# Altium footprint library Footprint-Lib-PhilsLab.PcbLib: 210 footprints (part 9 of 14)
Each footprint in its own frame and in the unit in brackets; x right, y up, seen from the top. Pads: shape width x height; smd on the part's side, far side on the other; paste and mask are expansions set on the pad; w line width, h text height; cw(c..) or ccw(c..) is an arc to the next point about the centre after c.
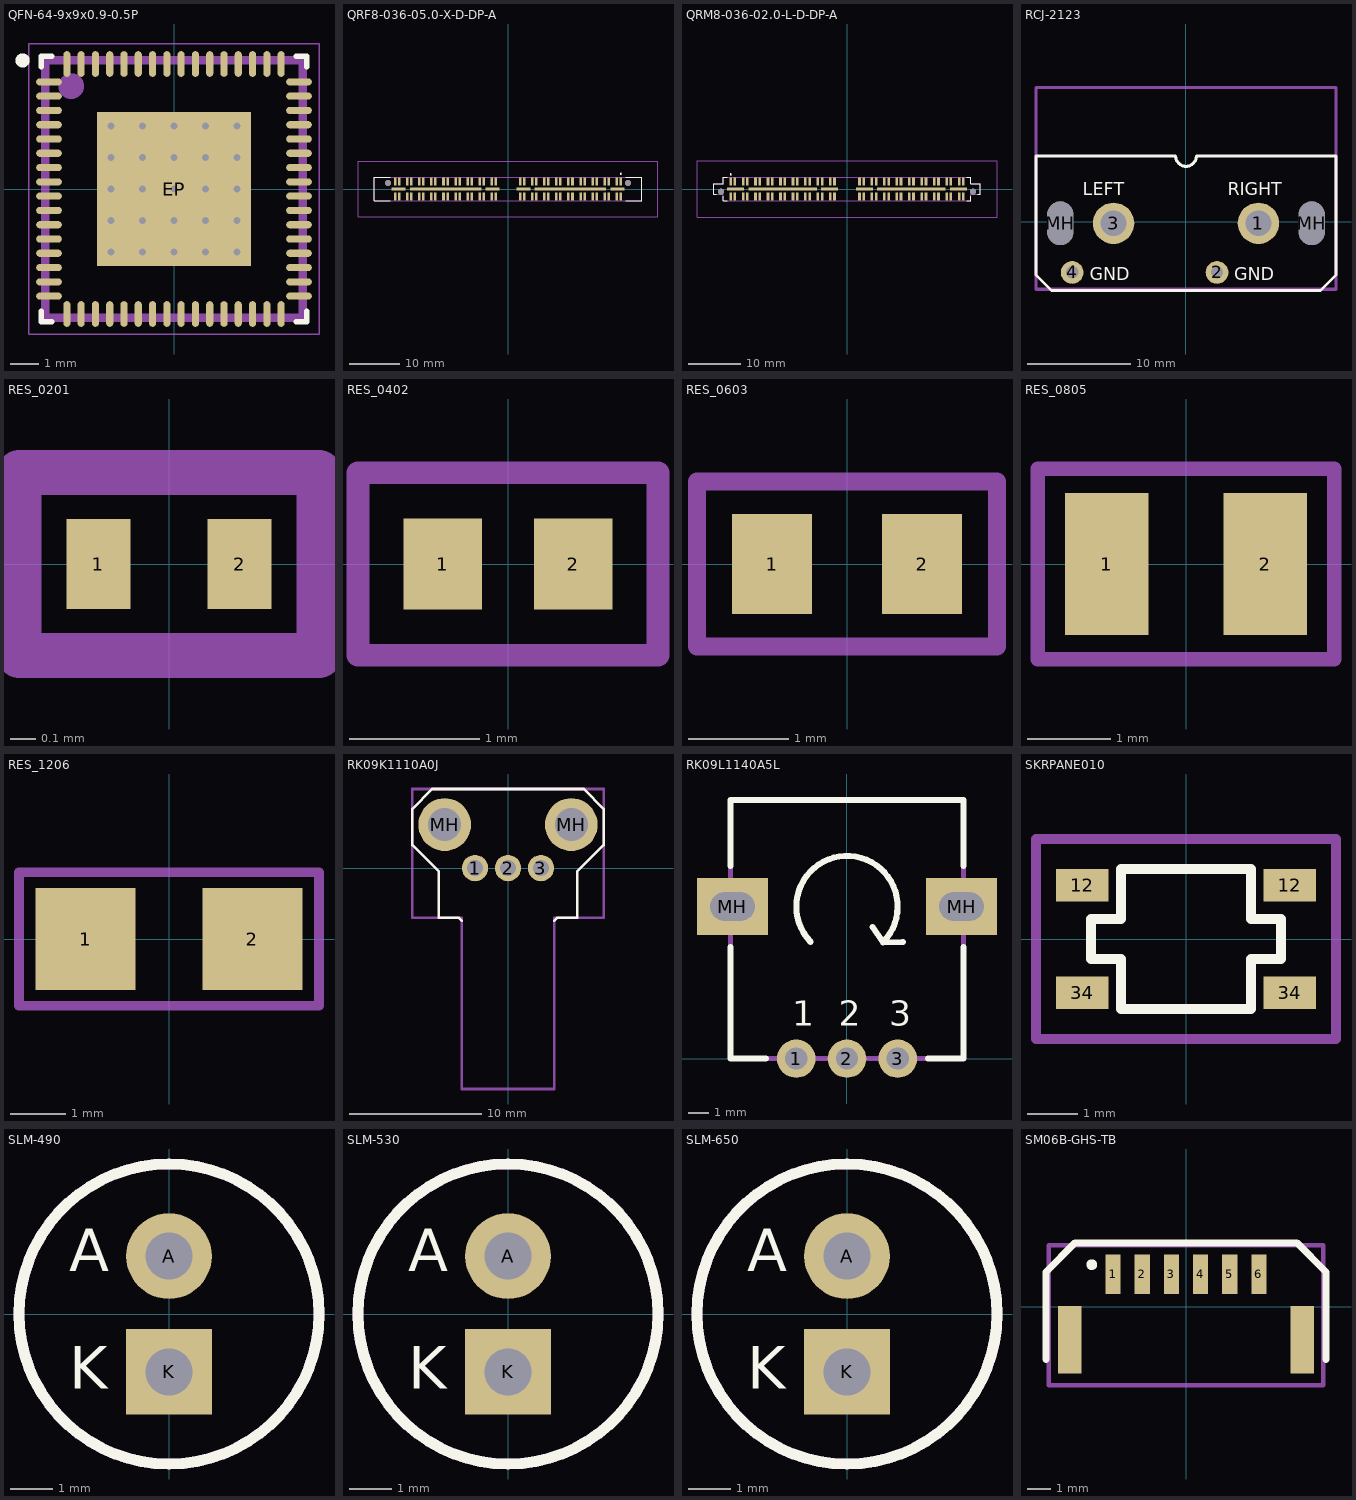
[diagram p8: the footprints below, top view; thin cyan lines are the x and y axes]

## QFN-64-9x9x0.9-0.5P [mm] "QFN, 64-Leads, Body 9.00x9.00mm, Pitch 0.50mm, Thermal Pad 5.40x5.40mm, IPC Medium Density"
height 1
pads (65):
  oval 0.9x0.25 smd mask+0.05: 1(-4.375,3.75) 2(-4.375,3.25) 3(-4.375,2.75) 4(-4.375,2.25) 5(-4.375,1.75) 6(-4.375,1.25) 7(-4.375,0.75) 8(-4.375,0.25) 9(-4.375,-0.25) 10(-4.375,-0.75) 11(-4.375,-1.25) 12(-4.375,-1.75) 13(-4.375,-2.25) 14(-4.375,-2.75) 15(-4.375,-3.25) 16(-4.375,-3.75) 33(4.375,-3.75) 34(4.375,-3.25) 35(4.375,-2.75) 36(4.375,-2.25) 37(4.375,-1.75) 38(4.375,-1.25) 39(4.375,-0.75) 40(4.375,-0.25) 41(4.375,0.25) 42(4.375,0.75) 43(4.375,1.25) 44(4.375,1.75) 45(4.375,2.25) 46(4.375,2.75) 47(4.375,3.25) 48(4.375,3.75)
  oval 0.25x0.9 smd mask+0.05: 17(-3.75,-4.375) 18(-3.25,-4.375) 19(-2.75,-4.375) 20(-2.25,-4.375) 21(-1.75,-4.375) 22(-1.25,-4.375) 23(-0.75,-4.375) 24(-0.25,-4.375) 25(0.25,-4.375) 26(0.75,-4.375) 27(1.25,-4.375) 28(1.75,-4.375) 29(2.25,-4.375) 30(2.75,-4.375) 31(3.25,-4.375) 32(3.75,-4.375) 49(3.75,4.375) 50(3.25,4.375) 51(2.75,4.375) 52(2.25,4.375) 53(1.75,4.375) 54(1.25,4.375) 55(0.75,4.375) 56(0.25,4.375) 57(-0.25,4.375) 58(-0.75,4.375) 59(-1.25,4.375) 60(-1.75,4.375) 61(-2.25,4.375) 62(-2.75,4.375) 63(-3.25,4.375) 64(-3.75,4.375)
  rect 5.4x5.4 smd: EP(0,0)
via 2.2,-2.2 diameter 0.6 hole 0.25
via 1.1,-2.2 diameter 0.6 hole 0.25
via 0,-2.2 diameter 0.6 hole 0.25
via -1.1,-2.2 diameter 0.6 hole 0.25
via -2.2,-2.2 diameter 0.6 hole 0.25
via 2.2,-1.1 diameter 0.6 hole 0.25
via 1.1,-1.1 diameter 0.6 hole 0.25
via 0,-1.1 diameter 0.6 hole 0.25
via -1.1,-1.1 diameter 0.6 hole 0.25
via -2.2,-1.1 diameter 0.6 hole 0.25
via 2.2,0 diameter 0.6 hole 0.25
via 1.1,0 diameter 0.6 hole 0.25
via 0,0 diameter 0.6 hole 0.25
via -1.1,0 diameter 0.6 hole 0.25
via -2.2,0 diameter 0.6 hole 0.25
via 2.2,1.1 diameter 0.6 hole 0.25
via 1.1,1.1 diameter 0.6 hole 0.25
via 0,1.1 diameter 0.6 hole 0.25
via -1.1,1.1 diameter 0.6 hole 0.25
via -2.2,1.1 diameter 0.6 hole 0.25
via 2.2,2.2 diameter 0.6 hole 0.25
via 1.1,2.2 diameter 0.6 hole 0.25
via 0,2.2 diameter 0.6 hole 0.25
via -1.1,2.2 diameter 0.6 hole 0.25
via -2.2,2.2 diameter 0.6 hole 0.25
Top Overlay:
  circle w0.25: c-5.3,4.5 r0.125
  lines w0.2: -4.65,-4.275 -4.65,-4.65 -4.275,-4.65 ; -4.65,4.275 -4.65,4.65 -4.275,4.65 ; 4.275,-4.65 4.65,-4.65 4.65,-4.275 ; 4.275,4.65 4.65,4.65 4.65,4.275
Mechanical 13:
  circle w0.5: c-3.6,3.6 r0.2
  lines w0.3: -4.5,-4.5 4.5,-4.5 4.5,4.5 -4.5,4.5 -4.5,-4.5
  text "'.Designator'" at -5.665,-0.417 h1
Mechanical 15:
  lines w0.05: -5.075,-5.075 5.075,-5.075 5.075,5.075 -5.075,5.075 -5.075,-5.075
  lines w0.1: -0.5,0 0.5,0 ; 0,-0.5 0,0.5
3D body "QFN-64-9x9x0.9-0.5P.step": height 1, standoff 0, extent -4.501,-4.501 4.501,4.501

## QRF8-036-05.0-X-D-DP-A [mm]
pads (80):
  rect 0.5x1.65 smd: 1(22.4,1.475) 2(22.4,-1.475) 3(21.6,1.475) 4(21.6,-1.475) 5(20,1.475) 6(20,-1.475) 7(19.2,1.475) 8(19.2,-1.475) 9(17.6,1.475) 10(17.6,-1.475) 11(16.8,1.475) 12(16.8,-1.475) 13(15.2,1.475) 14(15.2,-1.475) 15(14.4,1.475) 16(14.4,-1.475) 17(12.8,1.475) 18(12.8,-1.475) 19(12,1.475) 20(12,-1.475) 21(10.4,1.475) 22(10.4,-1.475) 23(9.6,1.475) 24(9.6,-1.475) 25(8,1.475) 26(8,-1.475) 27(7.2,1.475) 28(7.2,-1.475) 29(5.6,1.475) 30(5.6,-1.475) 31(4.8,1.475) 32(4.8,-1.475) 33(3.2,1.475) 34(3.2,-1.475) 35(2.4,1.475) 36(2.4,-1.475) 37(-2.4,1.475) 38(-2.4,-1.475) 39(-3.2,1.475) 40(-3.2,-1.475) 41(-4.8,1.475) 42(-4.8,-1.475) 43(-5.6,1.475) 44(-5.6,-1.475) 45(-7.2,1.475) 46(-7.2,-1.475) 47(-8,1.475) 48(-8,-1.475) 49(-9.6,1.475) 50(-9.6,-1.475) 51(-10.4,1.475) 52(-10.4,-1.475) 53(-12,1.475) 54(-12,-1.475) 55(-12.8,1.475) 56(-12.8,-1.475) 57(-14.4,1.475) 58(-14.4,-1.475) 59(-15.2,1.475) 60(-15.2,-1.475) 61(-16.8,1.475) 62(-16.8,-1.475) 63(-17.6,1.475) 64(-17.6,-1.475) 65(-19.2,1.475) 66(-19.2,-1.475) 67(-20,1.475) 68(-20,-1.475) 69(-21.6,1.475) 70(-21.6,-1.475) 71(-22.4,1.475) 72(-22.4,-1.475)
  rect 2.76x0.56 smd: 73(-21.72,0) 73(-3.08,0) 73(3.08,0) 73(21.72,0)
  rect 14.19x0.56 smd: 73(-12.4,0) 73(12.4,0)
  round 1.13 hole 1.13 unplated: ""(-23.8,1.2) ""(23.8,1.2)
Top Overlay:
  circle w0.2: c22.4,3 r0.1
  lines w0.2: -23.4,-2.3 -26.585,-2.3 -26.585,2.3 -23.4,2.3 ; 23.4,-2.3 26.585,-2.3 26.585,2.3 23.4,2.3
Mechanical 13:
  circle w0.2: c22.4,3 r0.1
  lines w0.1: -26.585,-2.3 -26.585,2.3 26.585,2.3 26.585,-2.3 -26.585,-2.3
  text "'.Designator'" at -6.315,-1.4 h1
Mechanical 15:
  lines w0.05: -29.765,-5.48 29.765,-5.48 29.765,5.48 -29.765,5.48 -29.765,-5.48
3D body "QRF8-036-05_0-L-D-DP-A.stp": height 6.51, standoff -1.03, extent -26.585,-2.3 26.585,2.3

## QRM8-036-02.0-L-D-DP-A [mm]
pads (80):
  rect 0.5x1.5 smd: 1(-22.4,1.425) 2(-22.4,-1.425) 3(-21.6,1.425) 4(-21.6,-1.425) 5(-20,1.425) 6(-20,-1.425) 7(-19.2,1.425) 8(-19.2,-1.425) 9(-17.6,1.425) 10(-17.6,-1.425) 11(-16.8,1.425) 12(-16.8,-1.425) 13(-15.2,1.425) 14(-15.2,-1.425) 15(-14.4,1.425) 16(-14.4,-1.425) 17(-12.8,1.425) 18(-12.8,-1.425) 19(-12,1.425) 20(-12,-1.425) 21(-10.4,1.425) 22(-10.4,-1.425) 23(-9.6,1.425) 24(-9.6,-1.425) 25(-8,1.425) 26(-8,-1.425) 27(-7.2,1.425) 28(-7.2,-1.425) 29(-5.6,1.425) 30(-5.6,-1.425) 31(-4.8,1.425) 32(-4.8,-1.425) 33(-3.2,1.425) 34(-3.2,-1.425) 35(-2.4,1.425) 36(-2.4,-1.425) 37(2.4,1.425) 38(2.4,-1.425) 39(3.2,1.425) 40(3.2,-1.425) 41(4.8,1.425) 42(4.8,-1.425) 43(5.6,1.425) 44(5.6,-1.425) 45(7.2,1.425) 46(7.2,-1.425) 47(8,1.425) 48(8,-1.425) 49(9.6,1.425) 50(9.6,-1.425) 51(10.4,1.425) 52(10.4,-1.425) 53(12,1.425) 54(12,-1.425) 55(12.8,1.425) 56(12.8,-1.425) 57(14.4,1.425) 58(14.4,-1.425) 59(15.2,1.425) 60(15.2,-1.425) 61(16.8,1.425) 62(16.8,-1.425) 63(17.6,1.425) 64(17.6,-1.425) 65(19.2,1.425) 66(19.2,-1.425) 67(20,1.425) 68(20,-1.425) 69(21.6,1.425) 70(21.6,-1.425) 71(22.4,1.425) 72(22.4,-1.425)
  rect 3.28x0.51 smd: 73(-21.46,0) 73(-3.33,0) 73(3.33,0) 73(21.46,0)
  rect 13.15x0.51 smd: 73(-12.395,0) 73(12.395,0)
  round 1.13 hole 1.13 unplated: ""(-24.25,-0.5) ""(24.25,-0.5)
Top Overlay:
  circle w0.2: c-22.4,2.81 r0.1
  lines w0.2: -25.165,-1.05 -25.685,-1.05 -25.685,1.05 -23.825,1.05 -23.825,2.3 -23,2.3 ; -23.825,-1.415 -23.825,-2.3 -23,-2.3 ; 23,-2.3 23.825,-2.3 23.825,-1.415 ; 23,2.3 23.825,2.3 23.825,1.05 25.685,1.05 25.685,-1.05 25.165,-1.05
Mechanical 13:
  circle w0.2: c-22.4,2.81 r0.1
  lines w0.1: -25.685,-1.05 -23.825,-1.05 -23.825,-2.3 23.825,-2.3 23.825,-1.05 25.685,-1.05 25.685,1.05 23.825,1.05 23.825,2.3 -23.825,2.3 -23.825,1.05 -25.685,1.05 -25.685,-1.05
  text "'.Designator'" at -6.315,-1.4 h1
Mechanical 15:
  lines w0.05: -28.865,-5.48 28.865,-5.48 28.865,5.48 -28.865,5.48 -28.865,-5.48
3D body "QRM8-036-02_0-L-D-DP-A.stp": height 4.82, standoff -1.31, extent -25.685,-2.3 25.685,2.3

## RCJ-2123 [mm]
pads (6):
  round 4 hole 2.5: 1(7,-0.125) 3(-7,-0.125)
  round 2.2 hole 1.2: 2(3,-4.875) 4(-11,-4.875)
  oval 2.5x4.2 hole 2.5 slot 4.2 at 90 deg unplated: MH(-12.15,-0.125) MH(12.15,-0.125)
Top Overlay:
  lines w0.3: -14.5,-5.125 -14.5,6.375 -1,6.375 ccw(c0,6.375) 0,5.375 ccw(c0,6.375) 1,6.375 14.5,6.375 14.5,-5.125 13,-6.625 -13,-6.625 -14.5,-5.125
  text "GND" at -9.316,-5.65 h1.25
  text "GND" at 4.684,-5.65 h1.25
  text "LEFT" at -9.962,2.6 h1.25
  text "RIGHT" at 4.038,2.6 h1.25
Mechanical 13:
  lines w0.3: -14.5,-6.5 14.5,-6.5 14.5,13 -14.5,13 -14.5,-5.5 -14.5,-6.5
  text "'.Designator'" at -7.231,-1.087 h1.25
3D body "CUI_DEVICES_RCJ-2123.step": height 20.51, standoff -4.19, extent -13.69,-5.127 13.71,13.173

## RES_0201 [mm]
pads (2):
  rect 0.25x0.35 smd mask+0.05: 1(-0.275,0) 2(0.275,0)
Mechanical 13:
  lines w0.175: -0.584,-0.356 0.584,-0.356 0.584,0.356 -0.584,0.356 -0.584,-0.356
  text "'.Designator'" at -5.665,-0.417 h1
3D body "R0201.step": height 0.15, standoff 0, extent -0.3,-0.15 0.3,0.15

## RES_0402 [mm]
pads (2):
  rect 0.6x0.7 smd: 1(-0.5,0) 2(0.5,0)
Mechanical 13:
  lines w0.175: -1.15,-0.7 -1.15,0.7 1.15,0.7 1.15,-0.7 -1.15,-0.7
  text "'.Designator'" at -5.665,-0.417 h1
3D body "R0402.step": height 0.3, standoff 0, extent -0.5,-0.25 0.5,0.25

## RES_0603 [mm]
pads (2):
  rect 0.8x1 smd: 1(-0.75,0) 2(0.75,0)
Mechanical 13:
  lines w0.175: -1.5,-0.825 1.5,-0.825 1.5,0.825 -1.5,0.825 -1.5,-0.825
  text "'.Designator'" at -5.665,-0.417 h1
3D body "R0603.step": height 0.52, standoff 0.01, extent -0.8,-0.43 0.8,0.43

## RES_0805 [mm]
pads (2):
  rect 1x1.7 smd: 1(-0.95,0) 2(0.95,0)
Mechanical 13:
  lines w0.175: -1.778,-1.143 -1.778,1.143 1.778,1.143 1.778,-1.143 -1.778,-1.143
  text "'.Designator'" at -5.665,-0.417 h1
3D body "R0805.step": height 0.47, standoff 0.01, extent -1,-0.63 1,0.63

## RES_1206 [mm]
pads (2):
  rect 1.8x1.84 smd: 1(-1.5,0) 2(1.5,0)
Mechanical 13:
  lines w0.175: -2.7,-1.2 2.7,-1.2 2.7,1.2 -2.7,1.2 -2.7,-1.2
  text "'.Designator'" at -5.665,-0.417 h1
3D body "R1206.step": height 0.57, standoff 0.01, extent -1.6,-0.83 1.6,0.83

## RK09K1110A0J [mm]
pads (5):
  round 2 hole 1.2 mask+0.07: 1(-2.5,0) 2(0,0) 3(2.5,0)
  round 4 hole 2.5 mask+0.07: MH(-4.8,3.3) MH(4.8,3.3)
Top Overlay:
  lines w0.2: -3.5,-4 -3.75,-3.75 -5.25,-3.75 -5.25,-0.25 -7.25,1.75 -7.25,4.5 -5.75,6 -5.5,6 5.75,6 7.25,4.5 7.25,1.75 5.25,-0.25 5.25,-3.75 3.75,-3.75 3.5,-4
Mechanical 13:
  lines w0.2: -7.25,-3.75 -7.25,6 7.25,6 7.25,-3.75 3.5,-3.75 3.5,-16.75 -3.5,-16.75 -3.5,-3.75 -7.25,-3.75
  text "'.Designator'" at -7.231,-1.087 h1.25
3D body "RK09K1110-20.STEP": height 12.01, standoff -3.79, extent -4.9,-16.65 4.9,5.65

## RK09L1140A5L [mm]
pads (5):
  round 1.9 hole 1.1: 1(-2.5,0) 2(0,0) 3(2.5,0)
  rect 3.5x2.8 hole 1.4 slot 2.2 at 0 deg: MH(-5.65,7.5) MH(5.65,7.5)
Top Overlay:
  lines w0.3: -5.75,5.5 -5.75,0 -4,0 ; -5.75,9.5 -5.75,12.75 5.75,12.75 5.75,9.5 ; -1.798,5.763 cw(c0,7.5) 1.768,5.732 ; 1.25,6.5 1.768,5.732 ; 2.75,5.75 1.768,5.732 ; 4,0 5.75,0 5.75,5.5
  text "3" at 2.083,1.625 h1.25
  text "2" at -0.417,1.625 h1.25
  text "1" at -2.708,1.625 h1.25
Mechanical 13:
  lines w0.254: -5.75,0 5.75,0 5.75,12.75 -5.75,12.75 -5.75,0
  text "3" at 2.167,1.75 h1
  text "2" at -0.333,1.75 h1
  text "1" at -2.667,1.75 h1
  text "'.Designator'" at -5.665,7.083 h1
3D body "RK09L1140-F15.STEP": height 25.01, standoff -3.49, extent -6.048,-0.15 6.05,12.35

## SKRPANE010 [mm]
pads (4):
  rect 1.05x0.65 smd: 12(-2.075,1.075) 12(2.075,1.075) 34(-2.075,-1.075) 34(2.075,-1.075)
Top Overlay:
  lines w0.2: -1.9,-0.4 -1.9,0.4 -1.3,0.4 -1.3,1.4 1.3,1.4 1.3,0.4 1.9,0.4 1.9,-0.4 1.3,-0.4 1.3,-1.4 -1.3,-1.4 -1.3,-0.4 -1.9,-0.4
Mechanical 13:
  lines w0.2: -3,-2 3,-2 3,2 -3,2 -3,-2
  text "'.Designator'" at -6.315,-1.4 h1
3D body "SKRPANE010.step": height 2.51, standoff 0.01, extent -2.3,-1.6 2.3,1.6

## SLM-490 [mm]
pads (2):
  round 2 hole 1.1: A(0,1.35)
  rect 2x2 hole 1.1: K(0,-1.35)
Top Overlay:
  circle w0.254: c0,0 r3.5
  text "A" at -2.333,1 h1
  text "K" at -2.333,-1.75 h1
Bottom Overlay:
  circle w0.254: c0,0 r3.5
  text "K" at -1.667,-1.75 h1
  text "A" at -1.667,1 h1
Mechanical 13:
  circle w0.254: c0,0 r3.5
  text "'.Designator'" at -5.665,-0.417 h1
  text "A" at -0.333,1 h1
  text "K" at -0.333,-1.75 h1
3D body "SLM-490.step": height 16.78, standoff 0.01, extent -3.683,-3.683 3.683,3.683
3D body "LED-5mm.STEP": height 21.8, standoff -14, extent -3,-2.5 3,3

## SLM-530 [mm]
pads (2):
  round 2 hole 1.1: A(0,1.35)
  rect 2x2 hole 1.1: K(0,-1.35)
Top Overlay:
  circle w0.254: c0,0 r3.5
  text "K" at -2.333,-1.75 h1
  text "A" at -2.333,1 h1
Bottom Overlay:
  circle w0.254: c0,0 r3.5
  text "A" at -1.667,1 h1
  text "K" at -1.667,-1.75 h1
Mechanical 13:
  circle w0.254: c0,0 r3.5
  text "K" at -0.333,-1.75 h1
  text "A" at -0.333,1 h1
  text "'.Designator'" at -5.665,-0.417 h1
3D body "SLM-530.step": height 17.79, standoff 0.01, extent -3.683,-3.683 3.683,3.683
3D body "LED-5mm.STEP": height 22.8, standoff -13, extent -3,-2.5 3,3

## SLM-650 [mm]
pads (2):
  round 2 hole 1.1: A(0,1.35)
  rect 2x2 hole 1.1: K(0,-1.35)
Top Overlay:
  circle w0.254: c0,0 r3.5
  text "K" at -2.333,-1.75 h1
  text "A" at -2.333,1 h1
Bottom Overlay:
  circle w0.254: c0,0 r3.5
  text "A" at -1.667,1 h1
  text "K" at -1.667,-1.75 h1
Mechanical 13:
  circle w0.254: c0,0 r3.5
  text "K" at -0.333,-1.75 h1
  text "A" at -0.333,1 h1
  text "'.Designator'" at -5.665,-0.417 h1
3D body "SLM-650.step": height 20.84, standoff 0.01, extent -3.683,-3.683 3.683,3.683
3D body "LED-5mm.STEP": height 25.85, standoff -9.95, extent -2.99,-2.5 2.99,3

## SM06B-GHS-TB [mm]
pads (8):
  rect 0.65x1.7 smd: 1(-3.125,1.4) 2(-1.875,1.4) 3(-0.625,1.4) 4(0.625,1.4) 5(1.875,1.4) 6(3.125,1.4)
  rect 1x2.9 smd: ""(-4.975,-1.4) ""(4.975,-1.4)
Top Overlay:
  circle w0.254: c-4.035,1.813 r0.103
  lines w0.3: -6,-2.25 -6,1.5 -4.75,2.75 4.75,2.75 6,1.5 6,-2.25
Mechanical 13:
  circle w0.25: c-3.125,1.75 r0.1
  lines w0.2: -5.875,-3.35 -5.875,-1.35 -5.875,2.65 5.875,2.65 5.875,-3.35 -5.875,-3.35
  text "'.Designator'" at -5.665,-0.417 h1
3D body "SM06B-GHS-TB.STEP": height 4.26, standoff 0.01, extent -5.375,-2.8 5.375,2.05